# Altium footprint library First Board IMX6.PcbLib: 204 footprints (part 3 of 13)
Each footprint in its own frame and in the unit in brackets; x right, y up, seen from the top. Pads: shape width x height; smd on the part's side, far side on the other; paste and mask are expansions set on the pad; w line width, h text height; cw(c..) or ccw(c..) is an arc to the next point about the centre after c.
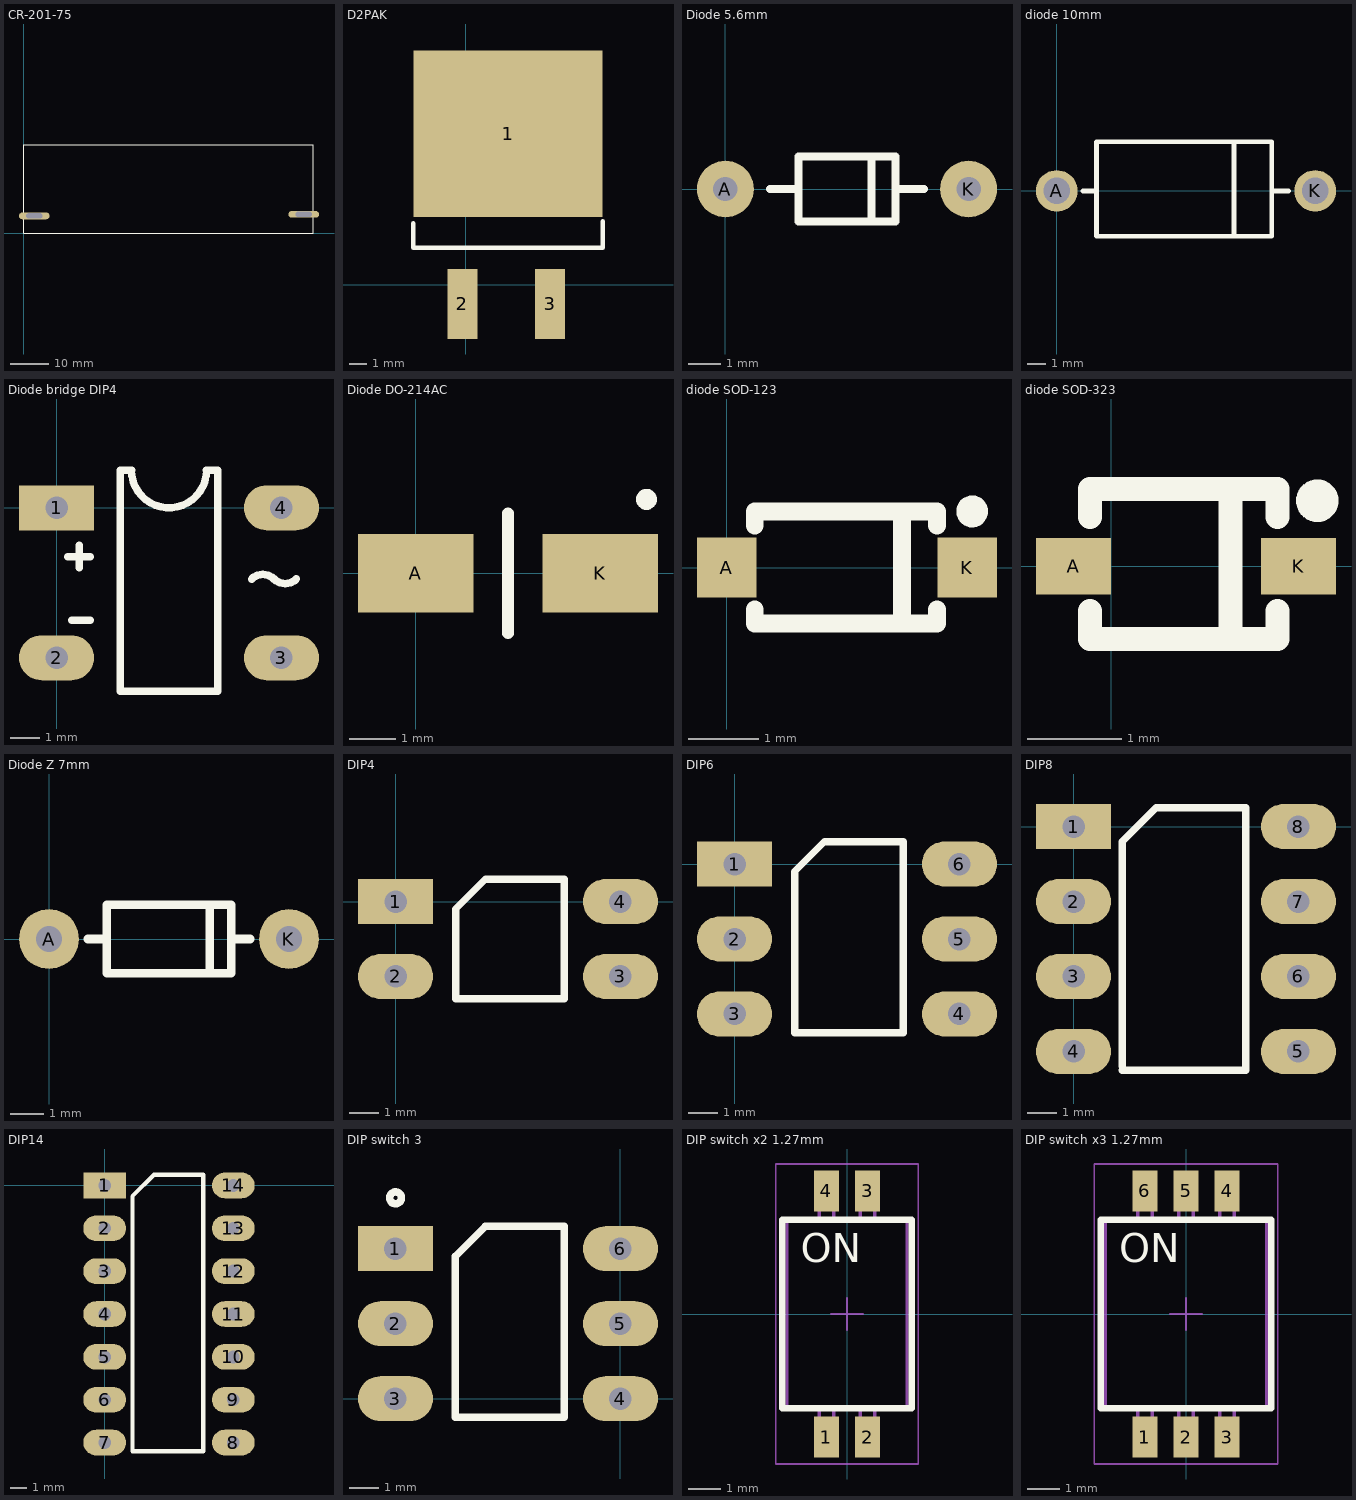
[diagram p2: the footprints below, top view; thin cyan lines are the x and y axes]

## CR-201-75 [mm]
pads (2):
  oval 8x1.8 hole 1.3 slot 4.2 at 0 deg: 1(2.7,4.6) 1(73,5)
Top Overlay:
  lines w0.254: 0,0 0,23.2 75.5,23.2 75.5,0 0,0

## D2PAK [mm]
pads (3):
  rect 10.8x9.5 smd: 1(2.4,8.6)
  rect 1.7x4 smd: 2(-0.2,-1.1) 3(4.8,-1.1)
Top Overlay:
  lines w0.254: -3,3.5 -3,2.1 7.8,2.1 7.8,3.6
3D body "D2PAK 2 pin.step": height 5.08, standoff 0.07, extent -2.78,-2.216 7.38,13.048

## Diode 5.6mm [mil]
pads (2):
  round 70 hole 30: A(0,0) K(300,0)
Top Overlay:
  lines w10: 55,0 90,0 ; 180,-40 180,40 ; 210,0 245,0 ; 90,0 90,-40 210,-40 210,40 90,40 90,0
3D body "diode axial 0.3.step": height 99.61, standoff -78.74, extent -13.77,-47.27 313.79,47.29

## diode 10mm [mm]
pads (2):
  round 2.2 hole 1.4: A(0,0) K(13.7,0)
Top Overlay:
  lines w0.254: 1.397,0 2.1,0 ; 9.391,-2.4 9.4,2.6 ; 11.4,0 12.3,0 ; 2.1,0 2.1,-2.4 11.4,-2.4 11.4,2.6 2.1,2.6 2.1,0

## Diode bridge DIP4 [mil]
pads (4):
  rect 100x60 hole 30: 1(0,0)
  oval 100x60 hole 30: 2(0,-200) 3(300,-200) 4(300,0)
Top Overlay:
  lines w10: 15,-65 45,-65 ; 20,-150 45,-150 ; 30,-80 30,-75 30,-50 ; 260,-95 cw(c275,-110) 290,-95 ccw(c305,-80) 320,-95 ; 85,-245 215,-245 215,50 200,50 cw(c150,50) 100,50 85,50 85,-245
3D body "diode bridge DIP-4.step": height 85.04, standoff -170.87, extent -7.08,-251.57 307.21,51.57

## Diode DO-214AC [mm]
pads (2):
  rect 2.5x1.7 smd: A(0,0) K(4,0)
Top Overlay:
  circle w0.254: c5,1.6 r0.1
  lines w0.254: 2,-1.3 2,1.3
3D body "DO-214AC SMA.step": height 2.5, standoff 0.1, extent -0.6,-1.3 4.6,1.3

## diode SOD-123 [mm]
pads (2):
  rect 0.85x0.85 smd: A(0,0) K(3.429,0)
Top Overlay:
  circle w0.254: c3.5,0.8 r0.1
  lines w0.254: 0.4,-0.6 0.4,-0.8 3,-0.8 3,-0.6 ; 0.4,0.6 0.4,0.8 3,0.8 3,0.6 ; 2.5,-0.8 2.5,0.8
3D body "SOD123.step": height 1.27, standoff 0, extent -0.072,-0.8 3.628,0.8

## diode SOD-323 [mm]
pads (2):
  rect 0.8x0.6 smd: A(-0.4,0) K(2,0)
Top Overlay:
  circle w0.254: c2.2,0.7 r0.1
  lines w0.254: -0.225,-0.475 -0.225,-0.775 1.775,-0.775 1.775,-0.475 ; -0.225,0.525 -0.225,0.825 1.775,0.825 1.775,0.525 ; 1.275,-0.675 1.275,0.825
3D body "SOD323-1.step": height 1.1, standoff 0, extent -0.5,-0.675 2.1,0.675

## Diode Z 7mm [mil]
pads (2):
  round 70 hole 30: A(0,0) K(280,0)
Top Overlay:
  lines w10: 45,0 67.5,0 ; 187.5,-40 187.5,40 ; 212.5,0 235,0 ; 67.5,0 67.5,-40 212.5,-40 212.5,40 67.5,40 67.5,0
3D body "axial diode.step": height 79.37, standoff -176.54, extent -7.64,-39.37 287.64,39.37

## DIP4 [mil]
pads (4):
  rect 100x60 hole 30: 1(0,0)
  oval 100x60 hole 30: 2(0,-100) 3(300,-100) 4(300,0)
Top Overlay:
  lines w10: 80,-129.92 80,-10 120,30 225,30 225,-129.92 80,-129.92
3D body "DIP4.step": height 169.69, standoff -129.13, extent -7.88,-157.48 307.09,60.63

## DIP6 [mil]
pads (6):
  rect 100x60 hole 30: 1(0,0)
  oval 100x60 hole 30: 2(0,-100) 3(0,-200) 4(300,-200) 5(300,-100) 6(300,0)
Top Overlay:
  lines w10: 80,-225 225,-225 225,30 120,30 80,-10 80,-225
3D body "DIP6.step": height 179.69, standoff -119.13, extent -9.96,-258.11 305,60

## DIP8 [mil]
pads (8):
  rect 100x60 hole 30: 1(0,0)
  oval 100x60 hole 30: 2(0,-100) 3(0,-200) 4(0,-300) 5(300,-300) 6(300,-200) 7(300,-100) 8(300,0)
Top Overlay:
  lines w10: 65,-325 230,-325 230,-315 230,25 110,25 65,-20 65,-320
3D body "DIP8.step": height 165, standoff -105, extent -5,-375 305,75

## DIP14 [mil]
pads (14):
  rect 100x60 hole 30: 1(0,0)
  oval 100x60 hole 30: 2(0,-100) 3(0,-200) 4(0,-300) 5(0,-400) 6(0,-500) 7(0,-600) 8(300,-600) 9(300,-500) 10(300,-400) 11(300,-300) 12(300,-200) 13(300,-100) 14(300,0)
Top Overlay:
  lines w10: 65,-620 230,-620 230,25 115,25 65,-25 65,-620
3D body "DIP14.step": height 165, standoff -105, extent -4.99,-674.99 305,75

## DIP switch 3 [mil]
pads (6):
  rect 100x60 hole 30: 1(-300,200)
  oval 100x60 hole 30: 2(-300,100) 3(-300,0) 4(0,0) 5(0,100) 6(0,200)
Top Overlay:
  circle w10: c-300,267.72 r7.87
  lines w10: -220,-25 -220,190 -180,230 -75,230 -75,-25 -220,-25
3D body "sw3 dip.stp": height 263.78, standoff -98.43, extent -348.43,-80.7 41.34,280.71

## DIP switch x2 1.27mm [mm]
pads (4):
  rect 0.76x1.27 smd: 1(-0.635,-3.81) 2(0.635,-3.81) 3(0.635,3.81) 4(-0.635,3.81)
Top Overlay:
  lines w0.2: -2.005,-2.925 -2.005,2.925 2.005,2.925 2.005,-2.925 -2.005,-2.925
  text "ON" at -1.435,1.6 h0.89
Mechanical 13:
  lines w0.1: -0.86,-2.9 -0.86,-4.32 -0.41,-4.32 -0.41,-2.9 ; -0.86,2.9 -0.86,4.32 -0.41,4.32 -0.41,2.9 ; 0.41,-2.9 0.41,-4.32 0.86,-4.32 0.86,-2.9 ; 0.41,2.9 0.41,4.32 0.86,4.32 0.86,2.9 ; -1.855,-2.9 1.855,-2.9 1.855,2.9 -1.855,2.9 -1.855,-2.9
  text "ON" at -1.435,1.6 h0.89
Mechanical 15:
  lines w0.05: -0.5,0 0.5,0 ; 0,-0.5 0,0.5 ; -2.205,-4.645 -2.205,4.645 2.205,4.645 2.205,-4.645 -2.205,-4.645
3D body "416131160802.stp": height 2.7, standoff 0, extent -1.855,-4.22 1.855,4.22

## DIP switch x3 1.27mm [mm]
pads (6):
  rect 0.76x1.27 smd: 1(-1.27,-3.81) 2(0,-3.81) 3(1.27,-3.81) 4(1.27,3.81) 5(0,3.81) 6(-1.27,3.81)
Top Overlay:
  lines w0.2: -2.64,-2.925 -2.64,2.925 2.64,2.925 2.64,-2.925 -2.64,-2.925
  text "ON" at -2.07,1.6 h0.89
Mechanical 13:
  lines w0.1: -1.495,-2.9 -1.495,-4.32 -1.045,-4.32 -1.045,-2.9 ; -1.495,2.9 -1.495,4.32 -1.045,4.32 -1.045,2.9 ; -0.225,-2.9 -0.225,-4.32 0.225,-4.32 0.225,-2.9 ; -0.225,2.9 -0.225,4.32 0.225,4.32 0.225,2.9 ; 1.045,-2.9 1.045,-4.32 1.495,-4.32 1.495,-2.9 ; 1.045,2.9 1.045,4.32 1.495,4.32 1.495,2.9 ; -2.49,-2.9 2.49,-2.9 2.49,2.9 -2.49,2.9 -2.49,-2.9
  text "ON" at -2.07,1.6 h0.89
Mechanical 15:
  lines w0.05: -0.5,0 0.5,0 ; 0,-0.5 0,0.5 ; -2.84,-4.645 -2.84,4.645 2.84,4.645 2.84,-4.645 -2.84,-4.645
3D body "416131160803.stp": height 2.65, standoff 0, extent -2.49,-4.22 2.49,4.22